# Altium footprint library TranDangKhoa-LIB.PcbLib: 1435 footprints (part 50 of 90)
Each footprint in its own frame and in the unit in brackets; x right, y up, seen from the top. Pads: shape width x height; smd on the part's side, far side on the other; paste and mask are expansions set on the pad; w line width, h text height; cw(c..) or ccw(c..) is an arc to the next point about the centre after c.
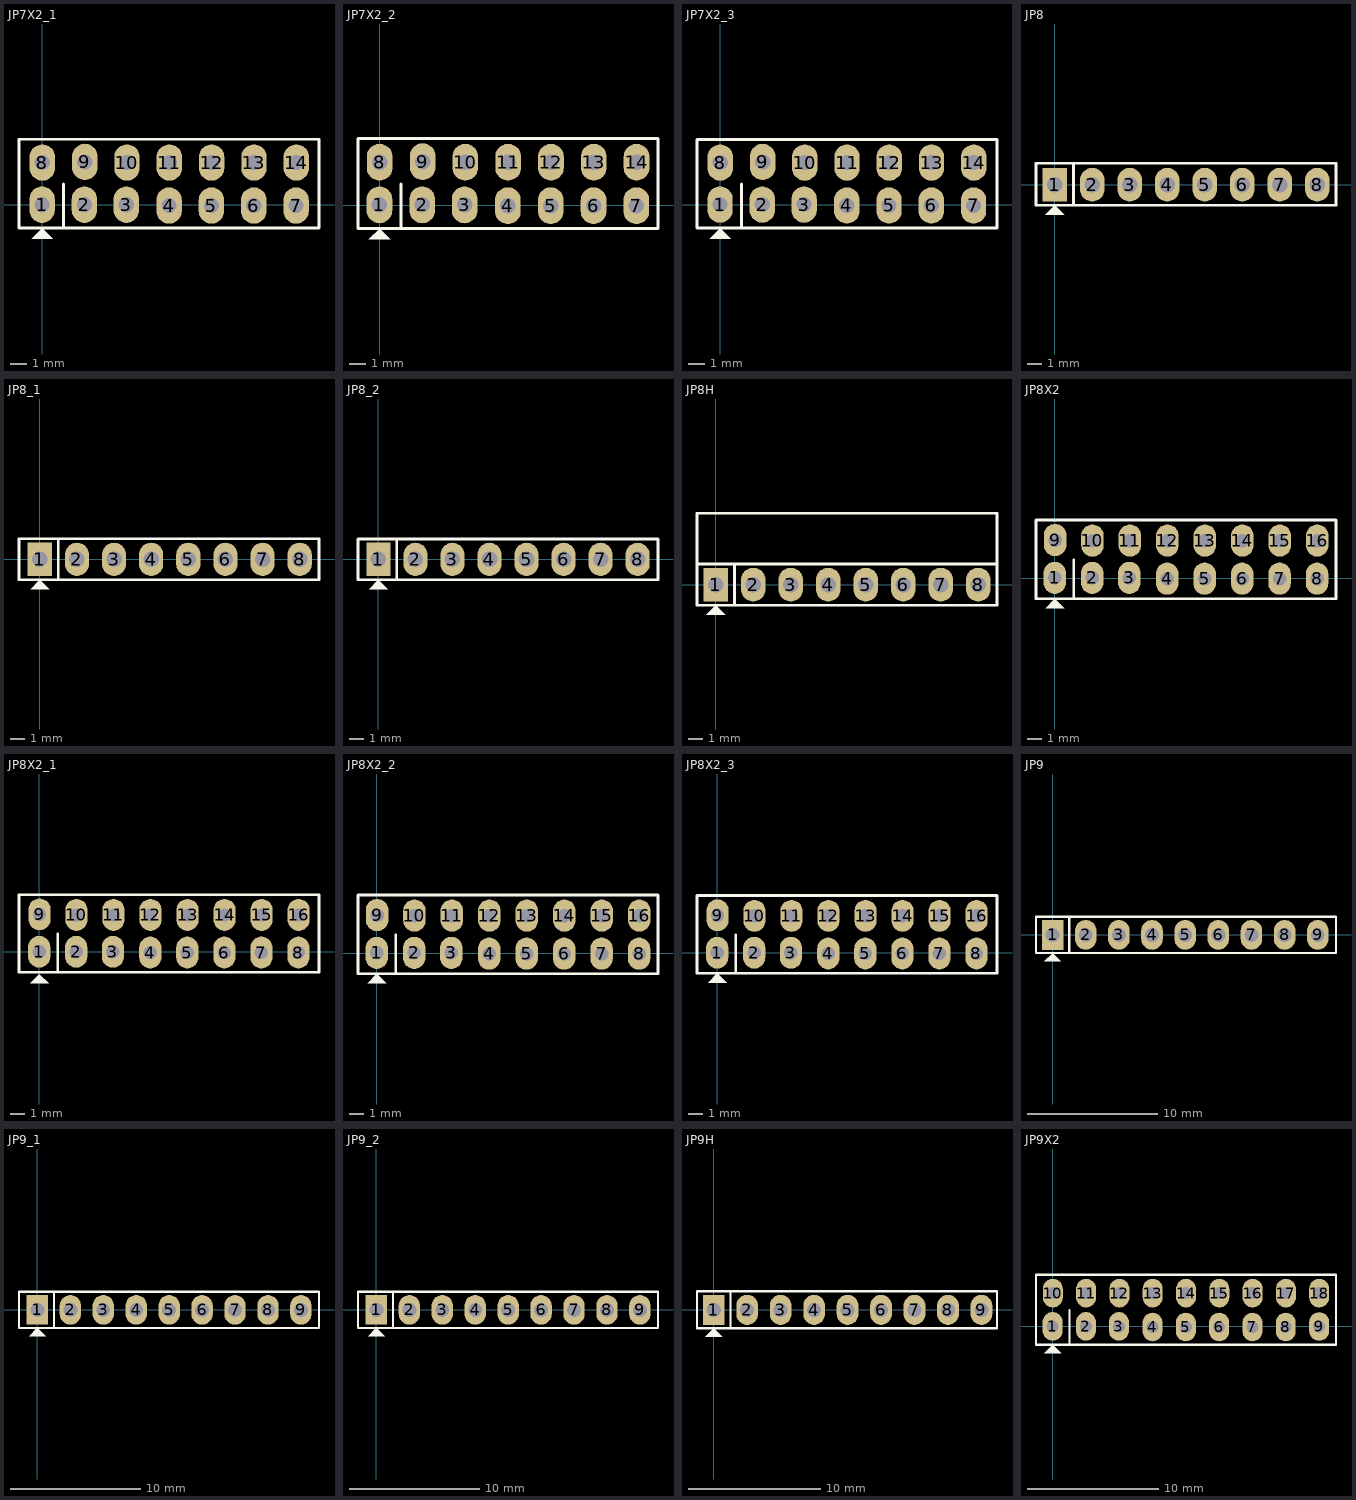
[diagram p49: the footprints below, top view; thin cyan lines are the x and y axes]

## JP7X2_1 [mil]
pads (14):
  oval 60x86 hole 36: 1(-0.5,0.5) 2(99.5,0.5) 3(198.5,0.5) 4(299.5,-1.5) 5(399.5,-1.5) 6(499.5,-1.5) 7(599.5,-1.5) 8(0,100) 9(100.5,101.5) 10(200,100) 11(300,100) 12(400,100) 13(500,100) 14(600,100)
Top Overlay:
  region: 0,-55 -25,-80 25,-80
  lines w7: 50,-55 50,49 ; -55,-55 -55,155 653.54,155 653.54,-55 -55,-55
3D body "female_header_a-bl254-dg-g14d.stp": height 366.14, standoff -94.49, extent -54.92,-48.42 654.93,148.43

## JP7X2_2 [mil]
pads (14):
  oval 60x86 hole 36: 1(-0.5,0.5) 2(99.5,0.5) 3(198.5,0.5) 4(299.5,-1.5) 5(399.5,-1.5) 6(499.5,-1.5) 7(599.5,-1.5) 8(0,100) 9(100.5,101.5) 10(200,100) 11(300,100) 12(400,100) 13(500,100) 14(600,100)
Top Overlay:
  region: 0,-55 -25,-80 25,-80
  lines w7: 50,-55 50,49 ; -50.5,-55 -50.5,50.5 -50.5,155 650,155 650,-55 -50.5,-55
3D body "pin_header_awl254-da-g14d.stp": height 216.54, standoff -98.43, extent -50.2,-12.4 649.8,494.69

## JP7X2_3 [mil]
pads (14):
  oval 60x86 hole 36: 1(-0.5,0.5) 2(99.5,0.5) 3(198.5,0.5) 4(299.5,-1.5) 5(399.5,-1.5) 6(499.5,-1.5) 7(599.5,-1.5) 8(0,100) 9(100.5,101.5) 10(200,100) 11(300,100) 12(400,100) 13(500,100) 14(600,100)
Top Overlay:
  region: 0,-55 -25,-80 25,-80
  lines w7: 50,-55 50,49 ; -55,-55 655,-55 655,155 -55,155 -55,46 -55,-55
3D body "female_header_a-bl254-da-g14d.stp": height 216.54, standoff -106.3, extent -54.13,-6.89 655.71,489.17

## JP8 [mil] "JP8"
height 200
pads (8):
  rect 65x90 hole 42: 1(0,0)
  oval 65x90 hole 42: 2(100,0) 3(200,0) 4(300,0) 5(400,0) 6(500,0) 7(600,0) 8(700,0)
Top Overlay:
  region: 0,-55 -25,-80 25,-80
  lines w7: 50,-55 50,55 ; -50,-55 750,-55 750,57 -50,57 -50,23 -50,-21 -50,-55
3D body "JP1-8.stp": height 354.33, standoff -86.61, extent -48.04,-50 748.03,48.43

## JP8_1 [mil] "JP8"
height 200
pads (8):
  rect 65x90 hole 42: 1(0,0)
  oval 65x90 hole 42: 2(100,0) 3(200,0) 4(300,0) 5(400,0) 6(500,0) 7(600,0) 8(700,0)
Top Overlay:
  region: 0,-55 -25,-80 25,-80
  lines w7: 50,-55 50,55 ; -56,-55 -56,55 752,55 752,-55 -56,-55
3D body "female_header_a-bl254-eg-g08d.stp": height 366.14, standoff -94.49, extent -54.71,-44.61 755.13,53.81

## JP8_2 [mil] "JP8"
height 200
pads (8):
  rect 65x90 hole 42: 1(0,0)
  oval 65x90 hole 42: 2(100,0) 3(200,0) 4(300,0) 5(400,0) 6(500,0) 7(600,0) 8(700,0)
Top Overlay:
  region: 0,-55 -25,-80 25,-80
  lines w7: 50,-55 50,55 ; -55,-55 -55,55 755,55 755,-55 -55,-55
3D body "female_header_a-bl254-ea-g08d.stp": height 108.27, standoff -116.14, extent -54.13,-8.86 755.71,387.21

## JP8H [mil]
pads (8):
  rect 65x90 hole 42: 1(0,0)
  oval 65x90 hole 42: 2(100,0) 3(200,0) 4(300,0) 5(400,0) 6(500,0) 7(600,0) 8(700,0)
Top Overlay:
  region: 0,-55 -25,-80 25,-80
  lines w7: -50,55 750,55 750,190 -50,190 -50,47 -50,-55 750,-55 750,57 ; 50,-55 50,55
3D body "JP8H.stp": height 108.27, standoff -84.65, extent -46.06,-14.96 746.06,423.62

## JP8X2 [mil]
pads (16):
  oval 60x86 hole 36: 1(-0.5,0.5) 2(99.5,0.5) 3(198.5,0.5) 4(299.5,-1.5) 5(399.5,-1.5) 6(499.5,-1.5) 7(599.5,-1.5) 8(699.5,-1.5) 9(0.5,101.5) 10(100,100) 11(200,100) 12(300,100) 13(400,100) 14(500,100) 15(600,100) 16(700,100)
Top Overlay:
  region: 0,-55 -25,-80 25,-80
  lines w7: 50,-55 50,49 ; -50.5,-55 -50.5,50.5 -50.5,155 750,155 750,-55 -50.5,-55
3D body "JP8X2.stp": height 335.25, standoff -117.51, extent -49.99,-49.99 750.01,150.01

## JP8X2_1 [mil]
pads (16):
  oval 60x86 hole 36: 1(-0.5,0.5) 2(99.5,0.5) 3(198.5,0.5) 4(299.5,-1.5) 5(399.5,-1.5) 6(499.5,-1.5) 7(599.5,-1.5) 8(699.5,-1.5) 9(0.5,101.5) 10(100,100) 11(200,100) 12(300,100) 13(400,100) 14(500,100) 15(600,100) 16(700,100)
Top Overlay:
  region: 0,-60 -25,-85 25,-85
  lines w7: 50,-55 50,49 ; -55,-55 755,-55 755,155 -55,155 -55,46 -55,-55
3D body "female_header_a-bl254-dg-g16d.stp": height 366.14, standoff -94.49, extent -55.12,-47.24 754.72,149.61

## JP8X2_2 [mil]
pads (16):
  oval 60x86 hole 36: 1(-0.5,0.5) 2(99.5,0.5) 3(198.5,0.5) 4(299.5,-1.5) 5(399.5,-1.5) 6(499.5,-1.5) 7(599.5,-1.5) 8(699.5,-1.5) 9(0.5,101.5) 10(100,100) 11(200,100) 12(300,100) 13(400,100) 14(500,100) 15(600,100) 16(700,100)
Top Overlay:
  region: 0,-55 -25,-80 25,-80
  lines w7: 50,-55 50,49 ; -50.5,-55 -50.5,50.5 -50.5,155 750,155 750,-55 -50.5,-55
3D body "pin_header_awl254-da-g16d.stp": height 216.54, standoff -98.43, extent -49.21,-11.42 750.79,495.67

## JP8X2_3 [mil]
pads (16):
  oval 60x86 hole 36: 1(-0.5,0.5) 2(99.5,0.5) 3(198.5,0.5) 4(299.5,-1.5) 5(399.5,-1.5) 6(499.5,-1.5) 7(599.5,-1.5) 8(699.5,-1.5) 9(0.5,101.5) 10(100,100) 11(200,100) 12(300,100) 13(400,100) 14(500,100) 15(600,100) 16(700,100)
Top Overlay:
  region: 0,-55 -25,-80 25,-80
  lines w7: 50,-55 50,49 ; -55,-55 755,-55 755,155 -55,155 -55,55 -55,-55
3D body "female_header_a-bl254-da-g16d.stp": height 216.54, standoff -106.3, extent -54.13,-7.87 755.71,488.19

## JP9 [mil] "JP9"
height 200
pads (9):
  rect 65x90 hole 42: 1(0,0)
  oval 65x90 hole 42: 2(100,0) 3(200,0) 4(300,0) 5(400,0) 6(500,0) 7(600,0) 8(700,0) 9(800,0)
Top Overlay:
  region: 0,-55 -25,-80 25,-80
  lines w7: 50,-55 50,55 ; -50,-55 -50,55 855,55 855,-55 -50,-55
3D body "pin_header_aw140-eg-g09d.stp": height 354.33, standoff -86.61, extent -46.06,-49.04 853.94,49.33

## JP9_1 [mil] "JP9_1"
height 200
pads (9):
  rect 65x90 hole 42: 1(0,0)
  oval 65x90 hole 42: 2(100,0) 3(200,0) 4(300,0) 5(400,0) 6(500,0) 7(600,0) 8(700,0) 9(800,0)
Top Overlay:
  region: 0,-55 -25,-80 25,-80
  lines w7: 50,-55 50,55 ; -56,-55 855,-55 855,55 -56,55 -56,-55
3D body "female_header_a-bl254-eg-g09d.stp": height 366.14, standoff -94.49, extent -55.12,-49.21 854.72,49.21

## JP9_2 [mil] "JP9"
height 200
pads (9):
  rect 65x90 hole 42: 1(0,0)
  oval 65x90 hole 42: 2(100,0) 3(200,0) 4(300,0) 5(400,0) 6(500,0) 7(600,0) 8(700,0) 9(800,0)
Top Overlay:
  region: 0,-55 -25,-80 25,-80
  lines w7: 50,-55 50,55 ; -56,-55 855,-55 855,55 -56,55 -56,-55
3D body "female_header_a-bl254-ea-g09d.stp": height 108.27, standoff -116.14, extent -53.15,-8.86 856.69,387.21

## JP9H [mil] "JP9"
height 200
pads (9):
  rect 65x90 hole 42: 1(0,0)
  oval 65x90 hole 42: 2(100,0) 3(200,0) 4(300,0) 5(400,0) 6(500,0) 7(600,0) 8(700,0) 9(800,0)
Top Overlay:
  region: 0,-55 -25,-80 25,-80
  lines w7: 50,-55 50,55 ; -50,-55 846.46,-55 846.46,55 -50,55 -50,-55
3D body "pin_header_aw140-ea-g09g.stp": height 108.27, standoff -84.65, extent -46.06,-14.96 846.06,423.62

## JP9X2 [mil]
pads (18):
  oval 60x86 hole 36: 1(-0.5,0.5) 2(99.5,0.5) 3(198.5,0.5) 4(299.5,-1.5) 5(399.5,-1.5) 6(499.5,-1.5) 7(599.5,-1.5) 8(699.5,-1.5) 9(800,0) 10(0,100) 11(100,100) 12(200,100) 13(300,100) 14(400,100) 15(500,100) 16(600,100) 17(700,100) 18(800,100)
Top Overlay:
  region: 0,-55 -25,-80 25,-80
  lines w7: 50,-55 50,49 ; -50.5,-55 -50.5,50.5 -50.5,155 850.39,155 850.39,-55 -50.5,-55
3D body "pin_header_awl254-dg-g18d.stp": height 366.14, standoff -86.61, extent -51.18,-48.82 848.82,151.18